# Altium footprint library common.PcbLib: 552 footprints (part 16 of 35)
Each footprint in its own frame and in the unit in brackets; x right, y up, seen from the top. Pads: shape width x height; smd on the part's side, far side on the other; paste and mask are expansions set on the pad; w line width, h text height; cw(c..) or ccw(c..) is an arc to the next point about the centre after c.
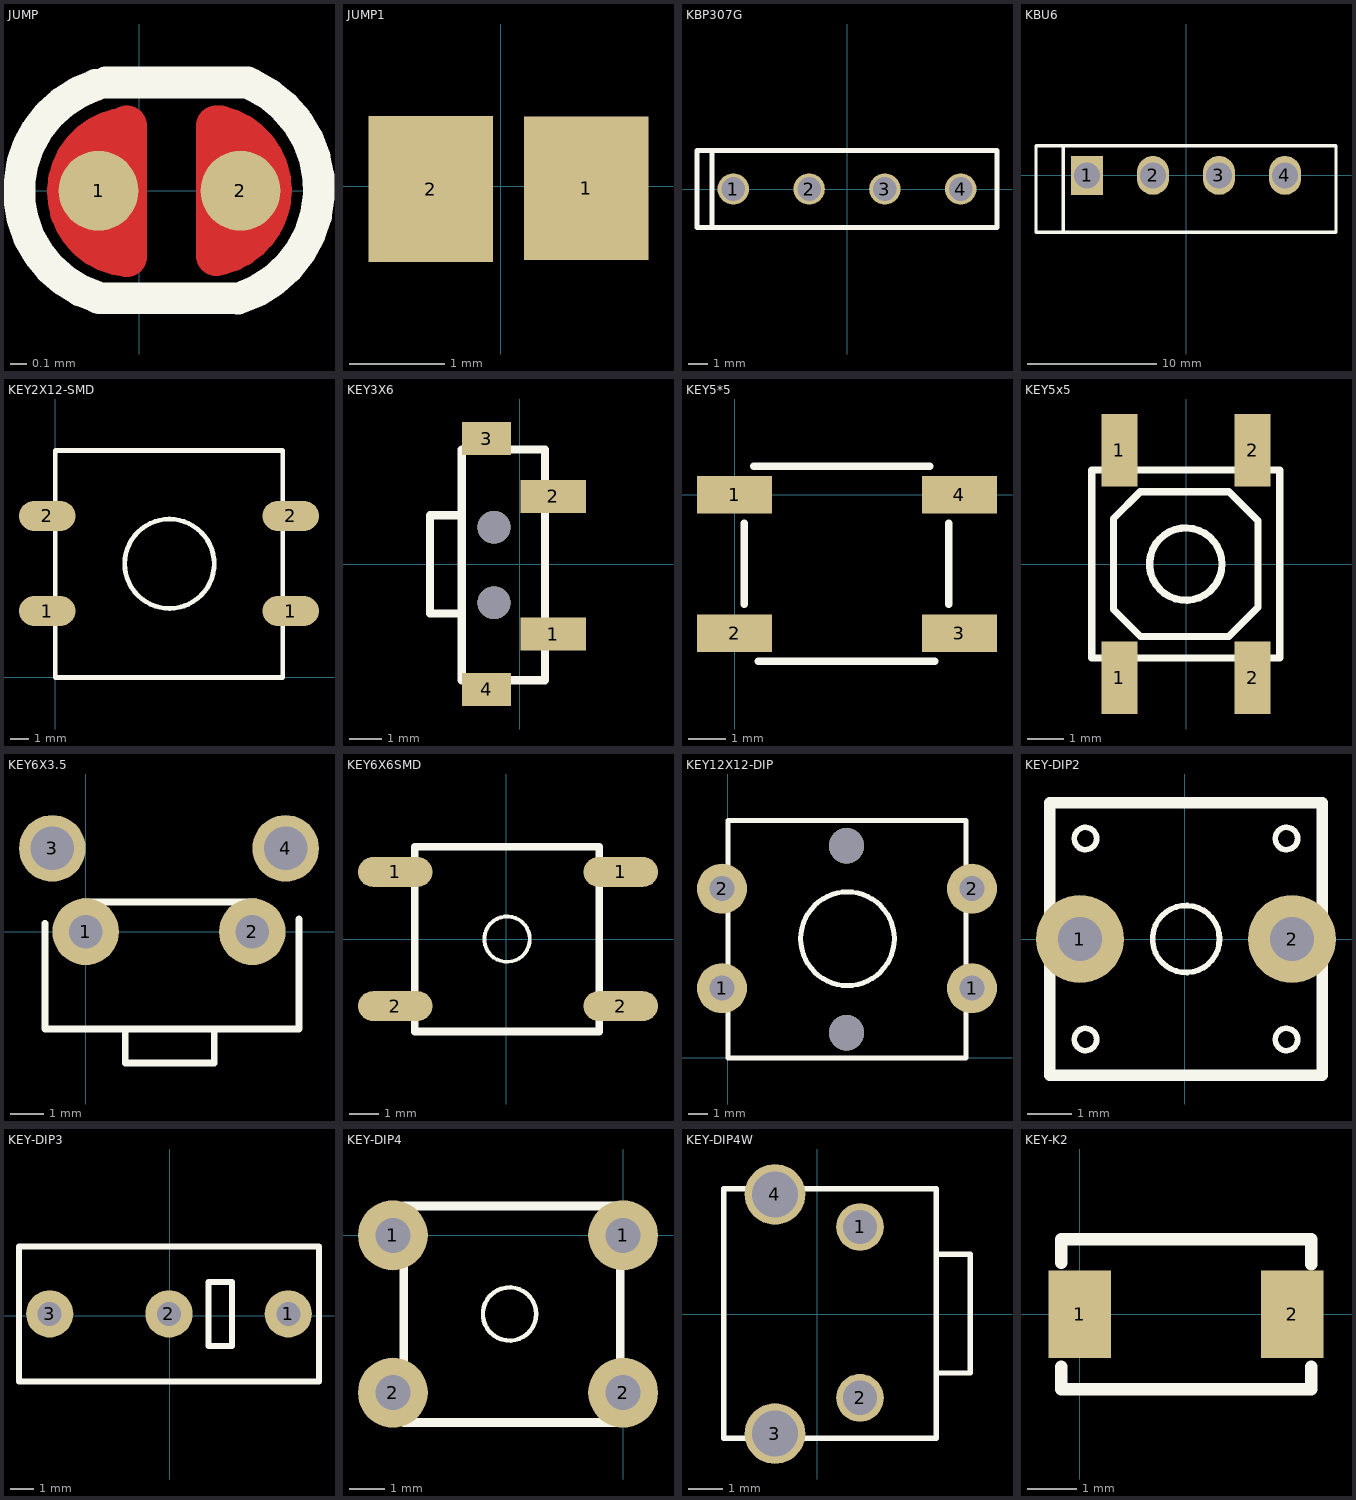
[diagram p15: the footprints below, top view; thin cyan lines are the x and y axes]

## JUMP [mm]
pads (2):
  round 0.5 smd: 1(-0.254,0) 2(0.635,0)
Top Layer:
  lines w0.254: -0.129,0.39 ccw(c-0.043,-0.007) -0.077,-0.412 -0.076,0.406 ; 0.483,-0.406 0.483,0.406 ; 0.508,0.406 cw(c0.417,0.003) 0.51,-0.399
Top Overlay:
  lines w0.2: -0.272,0.663 ccw(c-0.054,-0.001) -0.259,-0.668 ; -0.249,-0.673 0.615,-0.673 ; -0.208,0.678 0.678,0.678 ; 0.62,-0.676 ccw(c0.409,0.011) 0.706,0.665
Top Solder:
  lines w1.143: -0.076,0 0.483,0

## JUMP1 [mm]
pads (2):
  rect 1.3x1.5 smd: 1(0.897,-0.023)
  rect 1.3x1.524 smd: 2(-0.73,-0.03)

## KBP307G [mm]
pads (4):
  round 1.6 hole 1.2: 1(-5.775,0) 2(-1.925,0) 3(1.925,0) 4(5.775,0)
Top Overlay:
  lines w0.254: -6.858,-1.95 -6.858,1.95 ; -7.62,-1.95 -7.62,1.95 7.62,1.95 7.62,-1.95 -7.62,-1.95
3D body: height 14.5, standoff -9.7, extent -7.34,-2.378 7.239,2.632

## KBU6 [mm]
pads (4):
  rect 2.5x3 hole 2: 1(-7.65,0)
  oval 2.5x3 hole 2: 2(-2.55,0) 3(2.55,0) 4(7.65,0)
Top Overlay:
  lines w0.254: -9.5,-4.4 -9.5,2.3 ; -11.6,-4.4 11.6,-4.4 11.6,2.3 -11.6,2.3 -11.6,-4.4
3D body: height 25.65, standoff -19.65, extent -11.562,-4.572 11.638,2.378

## KEY2X12-SMD [mm]
pads (4):
  oval 3x1.6 smd: 1(-0.43,3.532) 1(12.524,3.532) 2(-0.43,8.588) 2(12.524,8.588)
Top Overlay:
  circle w0.254: c6.071,6.045 r2.378
  lines w0.254: 0,0 12.09,0 12.09,12.065 0,12.065 0,0
3D body: height 4, standoff 0, extent -0.629,0.065 12.821,12.065

## KEY3X6 [mm]
pads (4):
  rect 2x1 smd: 1(1.016,-2.138) 2(1.016,2.062)
  rect 1.5x1 smd: 3(-1.016,3.823) 4(-1.016,-3.823)
via -0.787,-1.181 diameter 1 hole 1
via -0.787,1.119 diameter 1 hole 1
Top Overlay:
  lines w0.254: -1.778,-1.511 -2.743,-1.511 -2.743,1.486 -1.778,1.486 ; -1.778,-3.543 0.762,-3.543 0.762,3.493 -1.778,3.493 -1.778,-3.543
3D body: height 3.5, standoff -0.7, extent -2.551,-3.942 1.049,3.859

## KEY5*5 [mm]
pads (4):
  rect 2x1 smd: 1(0,0) 2(0,-3.7) 3(6,-3.7) 4(6,0)
Top Overlay:
  lines w0.2: 0.254,-2.921 0.254,-0.762 ; 0.508,0.762 5.207,0.762 ; 0.635,-4.445 5.334,-4.445 ; 5.715,-2.921 5.715,-0.762
3D body: height 1.5, standoff 0, extent -0.254,-4.454 6.146,0.746

## KEY5x5 [mm]
pads (4):
  rect 1x2 smd: 1(-1.841,-3.15) 1(-1.841,3.15) 2(1.841,-3.15) 2(1.841,3.15)
Top Overlay:
  circle w0.2: c-0.007,-0.003 r1
  lines w0.2: -2.607,-2.603 -2.607,2.597 2.593,2.597 2.593,-2.603 -2.607,-2.603 ; -2.007,-1.257 -1.261,-2.003 1.185,-2.003 1.993,-1.194 1.993,1.194 1.19,1.997 -1.267,1.997 -2.007,1.257 -2.007,-1.257
3D body: height 1.2, standoff 0, extent -2.6,-2.6 2.6,2.6
3D body: height 2.5, standoff 1.2, extent -0.992,-0.998 1,0.998

## KEY6X3.5 [mm]
pads (4):
  round 2 hole 1: 1(0,0) 2(5,0)
  round 2 hole 1.3: 3(-1,2.5) 4(6,2.5)
Top Overlay:
  lines w0.2: 1.19,-2.921 1.19,-3.937 3.857,-3.937 3.857,-2.921
  lines w0.203: -1.223,0.254 -1.223,-2.921 6.397,-2.921 6.397,0.381 ; -0.08,0.889 0.833,0.889 5.104,0.889
3D body: height 3.8, standoff -4.1, extent -1.745,-3.986 6.665,3.15

## KEY6X6SMD [mm]
pads (4):
  oval 2.5x1 smd: 1(-3.734,2.25) 1(3.835,2.25) 2(-3.734,-2.25) 2(3.835,-2.25)
Top Overlay:
  circle w0.127: c0.02,-0.005 r0.762
  lines w0.254: -3.079,-3.104 3.119,-3.104 3.119,3.094 -3.079,3.094 -3.079,-3.104
3D body: height 4.5, standoff 0, extent -4.48,-3.105 4.52,3.095

## KEY12X12-DIP [mm]
pads (4):
  round 2.54 hole 1.27: 1(-0.303,3.532) 1(12.397,3.532) 2(-0.303,8.588) 2(12.397,8.588)
via 6.02,1.27 diameter 1.8 hole 1.8
via 6.02,10.77 diameter 1.8 hole 1.8
Top Overlay:
  circle w0.254: c6.071,6.045 r2.378
  lines w0.254: 0,0 0,12.065 12.09,12.065 12.09,0 0,0
3D body: height 7.3, standoff -3.5, extent -0.455,0 12.545,12

## KEY-DIP2 [mm] "6X6"
pads (2):
  round 2 hole 1: 1(-2.379,0.004) 2(2.447,0.004)
Top Overlay:
  circle w0.127: c-2.252,-2.282 r0.254
  circle w0.127: c2.32,-2.282 r0.254
  circle w0.127: c2.32,2.29 r0.254
  circle w0.127: c-2.252,2.29 r0.254
  circle w0.127: c0.034,0.004 r0.762
  lines w0.254: -3.065,-3.095 -3.065,3.103 3.133,3.103 3.133,-3.095 -3.065,-3.095
3D body: height 4.3, standoff -14, extent -2.949,-3.097 3.051,3.103

## KEY-DIP3 [mm]
pads (3):
  round 2 hole 1.016: 1(5.029,0.087) 3(-5.071,0.087)
  oval 2.007x2 hole 1.016: 2(-0.021,0.087)
Top Overlay:
  lines w0.254: -6.371,-2.773 6.329,-2.773 ; -6.371,-2.763 -6.371,2.937 6.329,2.937 6.329,-2.763 ; 1.649,-1.263 2.649,-1.263 2.649,1.437 1.649,1.437 1.649,-1.263
3D body: height 14.5, standoff -3.5, extent -6.375,-2.798 6.425,3.002

## KEY-DIP4 [mm] "6X6"
pads (4):
  round 2 hole 1: 1(-6.586,0) 1(0,0) 2(-6.586,-4.5) 2(0,-4.5)
Top Overlay:
  circle w0.127: c-3.25,-2.25 r0.762
  lines w0.254: -6.278,-5.354 -6.278,0.844 -0.08,0.844 -0.08,-5.354 -6.278,-5.354
3D body: height 4.3, standoff -3.5, extent -7.338,-5.529 0.93,0.971

## KEY-DIP4W [mil]
pads (4):
  round 55 hole 39.37: 1(49,100.3) 2(49,-96.56)
  round 70 hole 53.15: 3(-49,-137.8) 4(-49,137.8)
Top Overlay:
  lines w6: 136.84,-68.06 176,-68.06 176,68.94 136.84,68.94 ; -108,-143.06 136.84,-143.06 136.84,144.35 -108,144.35 -108,-143.06
3D body: height 137.8, standoff -291.34, extent -108.48,-166.84 173.02,175.68

## KEY-K2 [mil]
pads (2):
  rect 50x70 smd: 1(0,0) 2(170,0)
Top Overlay:
  lines w10: -15,-42 -15,-60 185,-60 185,-42 ; -15,41 -15,60 185,60 185,40
3D body: height 78.74, standoff -3.94, extent -12.6,-58 182.6,60.11